# Altium footprint library M_Derogarian Altium Library.PcbLib: 137 footprints (part 7 of 9)
Each footprint in its own frame and in the unit in brackets; x right, y up, seen from the top. Pads: shape width x height; smd on the part's side, far side on the other; paste and mask are expansions set on the pad; w line width, h text height; cw(c..) or ccw(c..) is an arc to the next point about the centre after c.
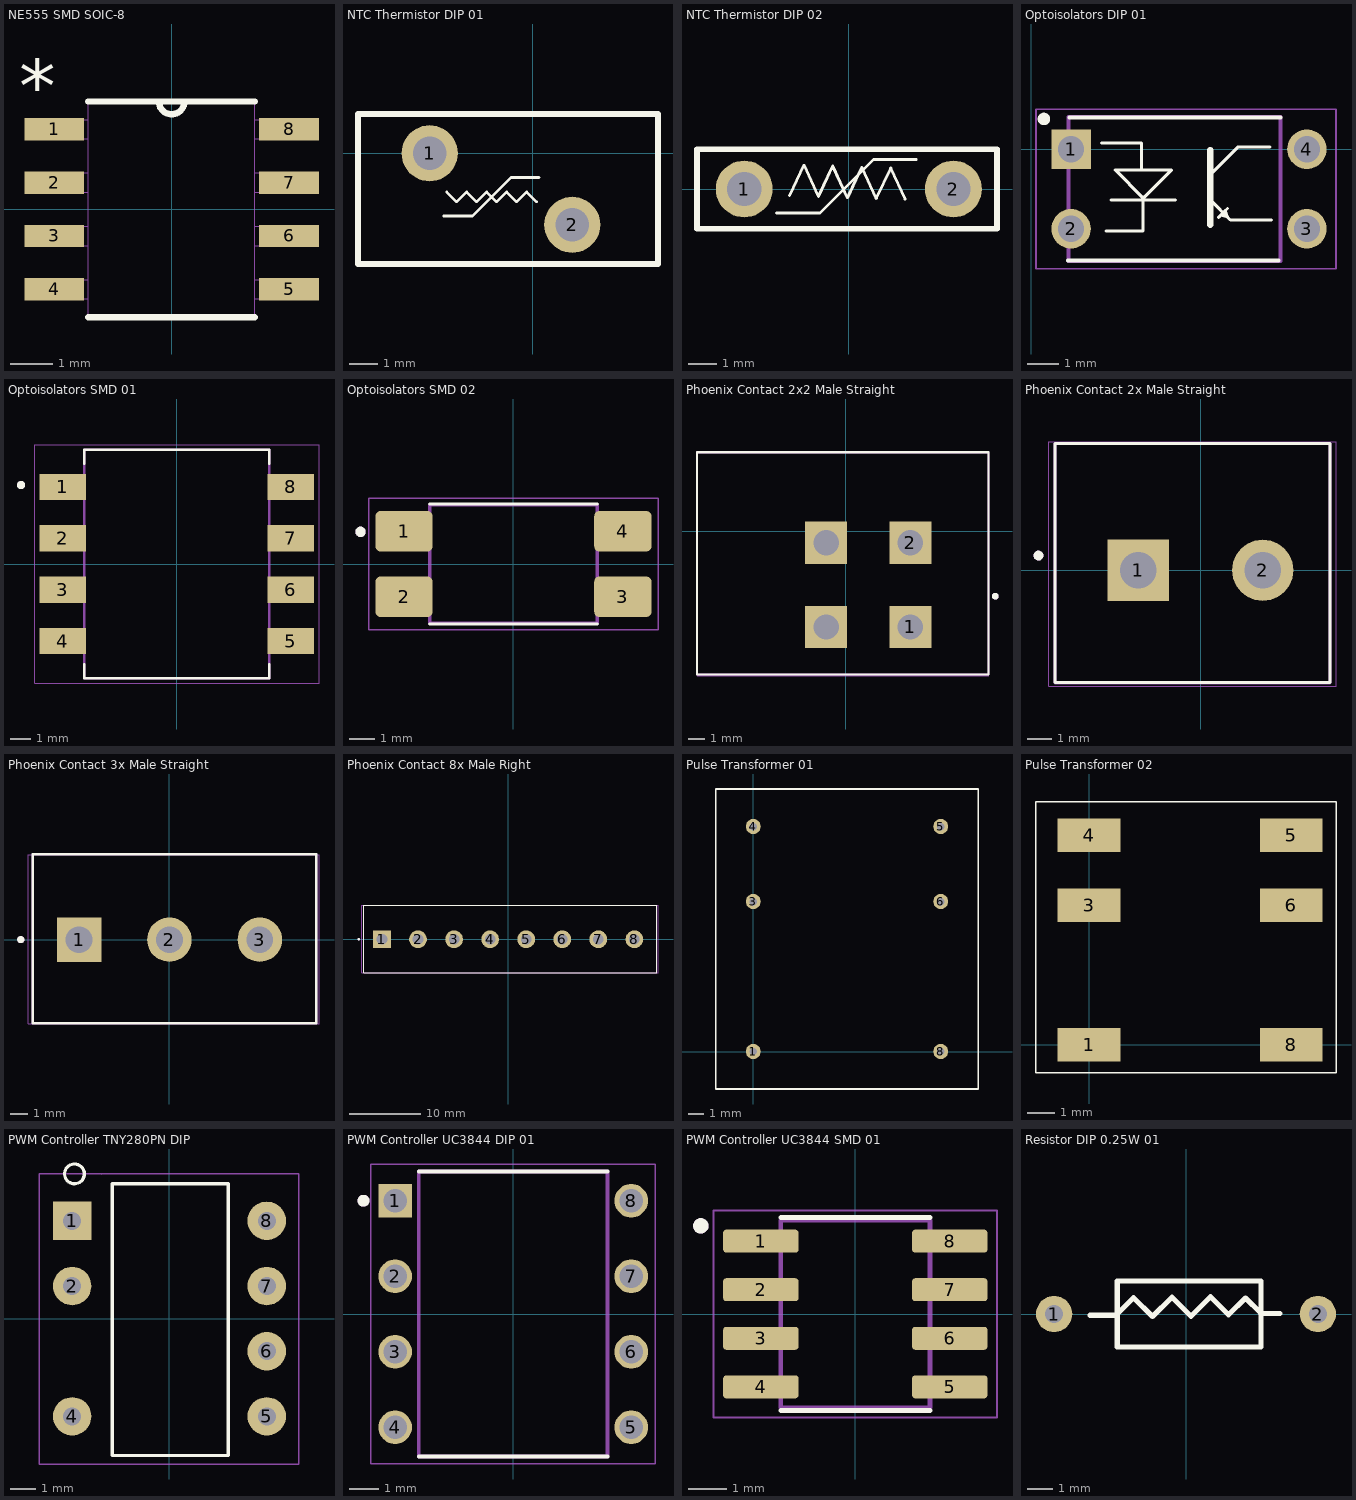
[diagram p6: the footprints below, top view; thin cyan lines are the x and y axes]

## NE555 SMD SOIC-8 [mil]
pads (8):
  rect 56x21 smd: 1(-110,75) 2(-110,25) 3(-110,-25) 4(-110,-75) 5(110,-75) 6(110,-25) 7(110,25) 8(110,75)
Top Overlay:
  lines w6: -78,-101 78,-101 ; -78,101 -12,101 ; 78,101 12,101 ; -12,101 ccw(c0,101) 12,101 ; -12,101 12,101
  text "*" at -143,91 h50
Mechanical 13:
  lines w0: -12,101 ccw(c0,101) 12,101 ; -12,101 12,101 ; -12,101 -78,101 -78,-101 78,-101 78,101 12,101 ; -124,-84 -124,-66 -78,-66 -78,-84 -124,-84 ; -124,-34 -124,-16 -78,-16 -78,-34 -124,-34 ; -124,16 -124,34 -78,34 -78,16 -124,16 ; -124,66 -124,84 -78,84 -78,66 -124,66 ; 78,-84 78,-66 124,-66 124,-84 78,-84 ; 78,-34 78,-16 124,-16 124,-34 78,-34 ; 78,16 78,34 124,34 124,16 78,16 ; 78,66 78,84 124,84 124,66 78,66
  text "*" at -143,91 h50
3D body "step_temp.STEP": height 68.9, standoff 0, extent -118.11,-96.46 118.11,96.46

## NTC Thermistor DIP 01 [mm]
pads (2):
  round 2 hole 1.2: 1(-3.674,0) 2(1.397,-2.54)
Top Overlay:
  lines w0.095: -3.072,-1.371 -2.719,-1.724 ; -2.717,-1.726 -2.363,-1.373 ; -2.361,-1.371 -2.008,-1.724 ; -2.006,-1.726 -1.652,-1.373 ; -1.649,-1.372 -1.295,-1.725 ; -1.294,-1.726 -0.941,-1.373 ; -0.938,-1.372 -0.584,-1.725 ; -0.583,-1.726 -0.23,-1.373 ; -0.227,-1.372 0.127,-1.725
  lines w0.1: -3.176,-2.234 -2.157,-2.234 -0.787,-0.863 0.213,-0.863
  lines w0.2: -6.223,-3.937 4.445,-3.937 4.445,1.4 -6.223,1.4 -6.223,-3.937
3D body "User Library-SL08-20002.STEP": height 11.8, standoff -3, extent -5.643,-3.411 3.357,0.889

## NTC Thermistor DIP 02 [mm]
pads (2):
  round 2 hole 1.2: 1(-3.674,0) 2(3.675,0)
Top Overlay:
  lines w0.1: -2.54,-0.838 -1.008,-0.838 0.872,1.041 2.372,1.041 ; -2.079,-0.224 -1.579,0.834 ; -1.571,0.834 -1.071,-0.259 ; -1.063,-0.25 -0.563,0.809 ; -0.555,0.783 -0.055,-0.31 ; -0.047,-0.301 0.453,0.758 ; 0.461,0.758 0.961,-0.335 ; 0.969,-0.326 1.469,0.732 ; 1.477,0.732 1.977,-0.36
  lines w0.2: -5.334,-1.4 5.207,-1.4 5.207,1.4 -5.334,1.4 -5.334,-1.4
3D body "User Library-RES_NTC-B57237S0509M0-THT_1500_0700_2200.STEP": height 21.1, standoff -4.5, extent -7.38,-3.444 7.62,3.556

## Optoisolators DIP 01 [mm]
pads (4):
  rect 1.26x1.26 hole 0.84: 1(1.27,0)
  round 1.26 hole 0.84: 2(1.27,-2.54) 3(8.8,-2.54) 4(8.8,0)
Top Overlay:
  circle w0.2: c0.406,0.965 r0.1
  lines w0.1: 2.248,0.203 3.518,0.203 3.518,-0.635 ; 2.388,-2.616 3.569,-2.616 3.569,-1.524 ; 2.553,-1.626 4.61,-1.626 ; 3.492,-0.66 4.483,-0.66 ; 5.715,-1.619 6.357,-2.261 7.671,-2.261 ; 5.715,-0.813 6.604,0.076 7.62,0.076 ; 5.98,-2.173 6.121,-2.032 6.263,-1.891 ; 6.051,-2.103 6.266,-2.17 6.192,-1.961 ; 4.483,-0.66 2.68,-0.66 3.581,-1.562 4.483,-0.66
  lines w0.127: 1.168,-3.556 7.899,-3.556 ; 1.219,1.016 7.95,1.016
  lines w0.2: 5.715,-1.619 5.715,-2.413 5.715,-0.025 5.715,-0.813
Mechanical 13:
  lines w0.127: 1.194,-3.57 1.194,1.03 7.95,1.03 7.95,-3.57 1.194,-3.57
Mechanical 15:
  lines w0.05: 0.152,-3.82 0.152,1.28 9.728,1.28 9.728,-3.82 0.152,-3.82
3D body "User Library-DIP4-7_62-2_54.STEP": height 4.3, standoff -2.7, extent 1.131,-3.702 9.011,0.888

## Optoisolators SMD 01 [mm]
pads (8):
  rect 2.29x1.3 smd: 1(-5.635,3.81) 2(-5.635,1.27) 3(-5.635,-1.27) 4(-5.635,-3.81) 5(5.635,-3.81) 6(5.635,-1.27) 7(5.635,1.27) 8(5.635,3.81)
Top Overlay:
  circle w0.2: c-7.7,3.9 r0.1
  lines w0.127: -4.575,-4.95 -4.575,-5.65 4.575,-5.65 4.575,-4.95 ; -4.575,4.95 -4.575,5.65 4.575,5.65 4.575,4.95
Mechanical 13:
  circle w0.2: c-7.7,3.9 r0.1
  lines w0.127: -4.575,-5.65 -4.575,5.65 4.575,5.65 4.575,-5.65 -4.575,-5.65
Mechanical 15:
  lines w0.05: -7.03,-5.9 -7.03,5.9 7.03,5.9 7.03,-5.9 -7.03,-5.9
3D body "HCNR200-500E.STEP": height 5, standoff 0, extent -6.19,-5.575 6.11,5.575

## Optoisolators SMD 02 [mm]
pads (4):
  rrect25% 2.22x1.57 smd: 1(-4.245,1.27) 2(-4.245,-1.27) 3(4.245,-1.27) 4(4.245,1.27)
Top Overlay:
  circle w0.2: c-5.93,1.247 r0.1
  lines w0.127: -3.25,-2.33 3.25,-2.33 ; -3.25,2.33 3.25,2.33
Mechanical 13:
  circle w0.2: c-5.93,1.247 r0.1
  lines w0.127: -3.25,-2.29 -3.25,2.29 3.25,2.29 3.25,-2.29 -3.25,-2.29
Mechanical 15:
  lines w0.05: -5.61,-2.55 -5.61,2.55 5.61,2.55 5.61,-2.55 -5.61,-2.55
3D body "User Library-PC817_Gullwing.STEP": height 3.85, standoff 0, extent -4.901,-2.342 5.099,2.238

## Phoenix Contact 2x2 Male Straight [mm]
pads (4):
  rect 2.5x2.5 hole 1.5: 1(3.825,-5.675) 2(3.825,-0.675) ""(-1.175,-5.675) ""(-1.175,-0.675)
Top Overlay:
  circle w0.2: c8.875,-3.85 r0.1
  lines w0.127: -8.85,-8.497 -8.85,4.7 8.475,4.7 8.475,-8.497 -8.85,-8.497
Mechanical 13:
  circle w0.2: c8.875,-3.85 r0.1
  lines w0.127: -8.85,-8.497 8.475,-8.497 8.475,4.7 -8.85,4.7 -8.85,-8.497
Mechanical 15:
  lines w0.05: -8.85,-8.573 8.475,-8.573 8.475,4.7 -8.85,4.7 -8.85,-8.573
3D body "User Library-1906158.STEP": height 16.49, standoff -3.01, extent -8.625,-8.675 8.375,4.525

## Phoenix Contact 2x Male Straight [mm]
pads (2):
  rect 2.5x2.5 hole 1.5: 1(-2.54,0)
  round 2.5 hole 1.5: 2(2.54,0)
Top Overlay:
  circle w0.2: c-6.615,0.6 r0.1
  lines w0.127: -5.94,-4.582 5.28,-4.582 5.28,5.172 -5.94,5.172 -5.94,-4.582
Mechanical 13:
  circle w0.2: c-6.615,0.6 r0.1
  lines w0.127: -5.94,-4.607 5.28,-4.607 5.28,5.172 -5.94,5.172 -5.94,-4.607
Mechanical 15:
  lines w0.05: -6.19,-4.734 5.53,-4.734 5.53,5.248 -6.19,5.248 -6.19,-4.734
3D body "1715721.stp": height 14.7, standoff -3, extent -5.776,-4.5 5.126,5.3

## Phoenix Contact 3x Male Straight [mm]
pads (3):
  rect 2.5x2.5 hole 1.5: 1(-5.08,0)
  round 2.5 hole 1.5: 2(0,0) 3(5.08,0)
Top Overlay:
  circle w0.2: c-8.355,0 r0.1
  lines w0.127: -7.68,-4.699 8.255,-4.699 8.255,4.801 -7.68,4.801 -7.68,-4.699
Mechanical 13:
  circle w0.2: c-8.355,0 r0.1
  lines w0.127: -7.68,-4.699 -7.68,4.801 8.255,4.801 8.255,-4.699 -7.68,-4.699
Mechanical 15:
  lines w0.05: -7.93,-4.724 8.407,-4.724 8.407,4.775 -7.93,4.775 -7.93,-4.724
3D body "User Library-1888690_02.STEP": height 15.5, standoff -3, extent -7.626,-4.725 8.184,4.775

## Phoenix Contact 8x Male Right [mm]
pads (8):
  rect 2.5x2.5 hole 1.5: 1(-17.78,0)
  round 2.5 hole 1.5: 2(-12.7,0) 3(-7.62,0) 4(-2.54,0) 5(2.54,0) 6(7.62,0) 7(12.7,0) 8(17.78,0)
Top Overlay:
  circle w0.2: c-21.055,0 r0.1
  lines w0.127: -20.38,-4.699 -20.38,4.801 20.955,4.801 20.955,-4.699 -20.38,-4.699
Mechanical 13:
  circle w0.2: c-21.055,0 r0.1
  lines w0.127: -20.38,-4.699 20.955,-4.699 20.955,4.801 -20.38,4.801 -20.38,-4.699
Mechanical 15:
  lines w0.05: -20.63,-4.724 21.107,-4.724 21.107,4.775 -20.63,4.775 -20.63,-4.724
3D body "1715789.stp": height 14.7, standoff -3, extent -21.046,-4.572 20.335,5.228

## Pulse Transformer 01 [mm]
pads (6):
  round 1 hole 0.5: 1(0,0) 3(0,10) 4(0,15) 5(12.5,15) 6(12.5,10) 8(12.5,0)
Top Overlay:
  lines w0.1: -2.5,-2.5 -2.5,17.5 ; 15,-2.5 15,17.5
  lines w0.127: -2.5,-2.5 15,-2.5 ; -2.5,17.5 15,17.5

## Pulse Transformer 02 [mm]
pads (6):
  rect 2.25x1.2 smd mask+0.08: 1(0,0) 3(0,5) 4(0,7.5) 5(7.25,7.5) 6(7.25,5) 8(7.25,0)
Top Overlay:
  lines w0.05: -1.9,-1 -1.9,8.7 8.85,8.7 8.85,-1 -1.9,-1
3D body "User Library-PULSE_PA2002NL.STEP": height 7.63, standoff 0, extent -0.95,-0.76 7.92,8.26

## PWM Controller TNY280PN DIP [mm]
pads (7):
  rect 1.5x1.5 hole 0.7: 1(-3.793,3.81)
  round 1.5 hole 0.7: 2(-3.793,1.27) 4(-3.793,-3.81) 5(3.793,-3.81) 6(3.793,-1.27) 7(3.793,1.27) 8(3.793,3.81)
Top Overlay:
  circle w0.127: c-3.7,5.639 r0.386
  lines w0.127: 2.269,-5.334 -2.227,-5.334 -2.227,5.258 2.294,5.258 2.294,-5.334
Mechanical 15:
  lines w0.05: -2.674,5.623 -2.659,5.639 ; -5.072,-5.664 -5.072,5.639 5.037,5.639 5.037,-5.664 -5.072,-5.664
3D body "User Library-DIP-8 for TNY-1.STEP": height 4.36, standoff -3, extent -3.978,-4.674 3.892,4.726

## PWM Controller UC3844 DIP 01 [mm]
pads (8):
  rect 1.13x1.13 hole 0.78: 1(-3.97,3.81)
  round 1.13 hole 0.78: 2(-3.97,1.27) 3(-3.97,-1.27) 4(-3.97,-3.81) 5(3.97,-3.81) 6(3.97,-1.27) 7(3.97,1.27) 8(3.97,3.81)
Top Overlay:
  circle w0.2: c-5.035,3.81 r0.1
  lines w0.127: -3.175,-4.795 3.175,-4.795 ; -3.175,4.795 3.175,4.795
Mechanical 13:
  circle w0.2: c-5.035,3.81 r0.1
  lines w0.127: -3.175,-4.795 3.175,-4.795 3.175,4.795 -3.175,4.795 -3.175,-4.795
Mechanical 15:
  lines w0.05: -4.785,-5.045 4.785,-5.045 4.785,5.045 -4.785,5.045 -4.785,-5.045
3D body "UC3843AN.STEP": height 5.08, standoff -3.18, extent -4.095,-4.541 4.095,5.049

## PWM Controller UC3844 SMD 01 [mm]
pads (8):
  rrect25% 1.97x0.6 smd: 1(-2.47,1.905) 2(-2.47,0.635) 3(-2.47,-0.635) 4(-2.47,-1.905) 5(2.47,-1.905) 6(2.47,-0.635) 7(2.47,0.635) 8(2.47,1.905)
Top Overlay:
  circle w0.2: c-4.04,2.305 r0.1
  lines w0.127: -1.95,-2.525 1.95,-2.525 ; -1.95,2.525 1.95,2.525
Mechanical 13:
  circle w0.2: c-4.04,2.305 r0.1
  lines w0.127: -1.95,-2.452 1.95,-2.452 1.95,2.452 -1.95,2.452 -1.95,-2.452
Mechanical 15:
  lines w0.05: -3.705,-2.702 3.705,-2.702 3.705,2.702 -3.705,2.702 -3.705,-2.702
3D body "UC3844AD8.STEP": height 1.75, standoff 0, extent -3,-2.45 3,2.45

## Resistor DIP 0.25W 01 [mm]
height 2.54
pads (2):
  round 1.4 hole 0.7: 1(-5.093,0) 2(5.093,0)
Top Overlay:
  lines w0.2: -3.696,-0.051 -2.705,-0.051 -2.026,0.629 -1.295,-0.102 -0.546,0.648 0.191,-0.089 0.946,0.667 1.645,-0.032 2.299,0.622 2.896,0.025 ; 2.883,0.025 3.632,0.025 ; -2.654,-1.27 -2.654,1.27 2.896,1.27 2.896,-1.27 -2.654,-1.27
3D body "User Library-RESISTOR, 0_25 W, 0_4 IN LEAD PITCH.STEP": height 2.93, standoff -2.54, extent -5.397,-1.156 5.372,1.156